# Altium footprint library TarabusLibrary.PcbLib: 591 footprints (part 8 of 37)
Each footprint in its own frame and in the unit in brackets; x right, y up, seen from the top. Pads: shape width x height; smd on the part's side, far side on the other; paste and mask are expansions set on the pad; w line width, h text height; cw(c..) or ccw(c..) is an arc to the next point about the centre after c.
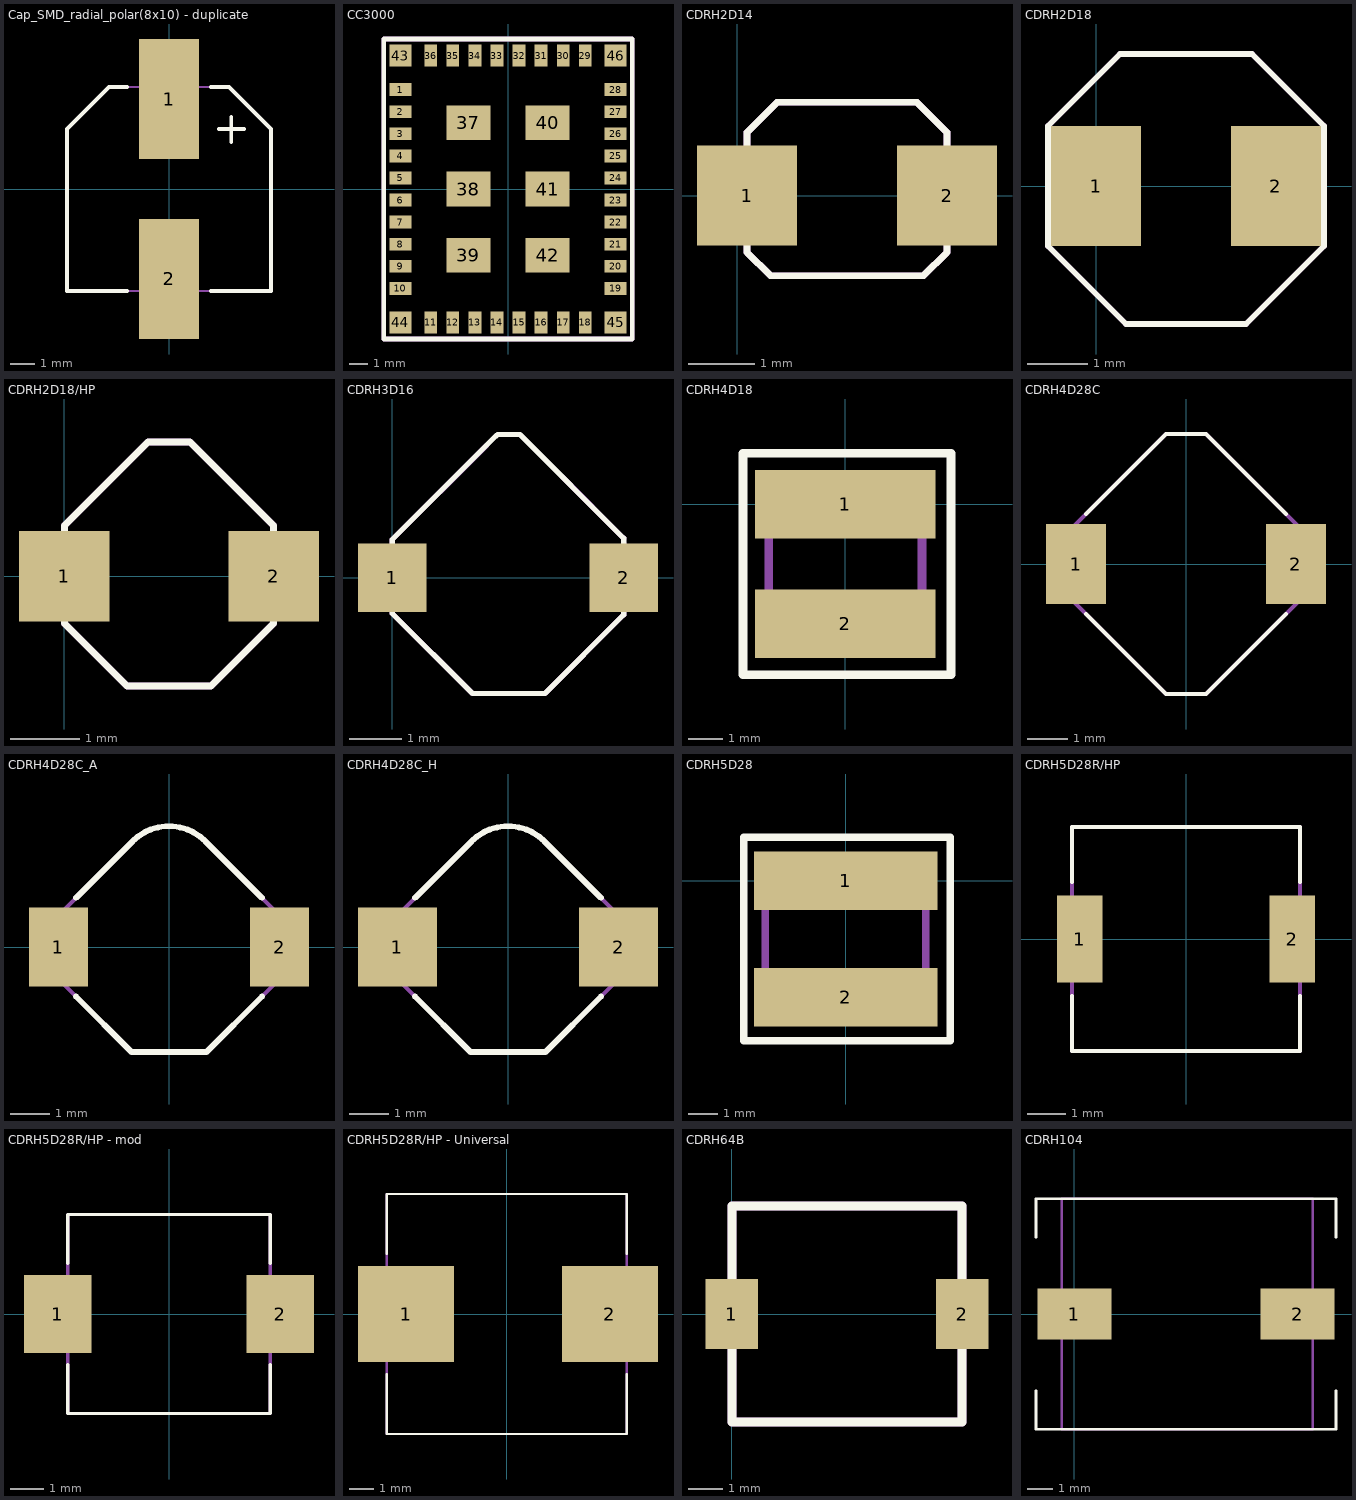
[diagram p7: the footprints below, top view; thin cyan lines are the x and y axes]

## Cap_SMD_radial_polar(8x10) - duplicate [mm] "8x10"
height 10
pads (2):
  rect 2.5x5 smd: 1(0,3.75) 2(0,-3.75)
Top Overlay:
  lines w0.15: -1.75,-4.25 -4.25,-4.25 -4.25,2.5 -2.5,4.25 -1.75,4.25 ; 1.75,-4.25 4.25,-4.25 4.25,2.5 2.5,4.25 1.75,4.25 ; 2.075,2.5 3.125,2.5 ; 2.6,1.95 2.6,3
Mechanical 7:
  lines w0.1: -4.25,-4.25 -4.25,2.5 -2.5,4.25 2.5,4.25 4.25,2.5 4.25,-4.25 -4.25,-4.25
Mechanical 10:
  text ".Designator" at -1.75,0.25 h0.8
  text ".Comment" at -1.25,-0.5 h0.6
3D body "User Library-ALU-F.STEP": height 10.2, standoff 0, extent -4.15,-4.95 4.15,4.95

## CC3000 [mm]
pads (46):
  rect 1.2x0.7 smd: 1(-5.85,5.4) 2(-5.85,4.2) 3(-5.85,3) 4(-5.85,1.8) 5(-5.85,0.6) 6(-5.85,-0.6) 7(-5.85,-1.8) 8(-5.85,-3) 9(-5.85,-4.2) 10(-5.85,-5.4) 19(5.85,-5.4) 20(5.85,-4.2) 21(5.85,-3) 22(5.85,-1.8) 23(5.85,-0.6) 24(5.85,0.6) 25(5.85,1.8) 26(5.85,3) 27(5.85,4.2) 28(5.85,5.4)
  rect 0.7x1.2 smd: 11(-4.2,-7.25) 12(-3,-7.25) 13(-1.8,-7.25) 14(-0.6,-7.25) 15(0.6,-7.25) 16(1.8,-7.25) 17(3,-7.25) 18(4.2,-7.25) 29(4.2,7.25) 30(3,7.25) 31(1.8,7.25) 32(0.6,7.25) 33(-0.6,7.25) 34(-1.8,7.25) 35(-3,7.25) 36(-4.2,7.25)
  rect 2.4x1.9 smd: 37(-2.15,3.6) 38(-2.15,0) 39(-2.15,-3.6) 40(2.15,3.6) 41(2.15,0) 42(2.15,-3.6)
  rect 1.2x1.2 smd: 43(-5.85,7.25) 44(-5.85,-7.25) 45(5.85,-7.25) 46(5.85,7.25)
Top Overlay:
  lines w0.254: -6.75,-8.15 -6.75,8.15 6.75,8.15 6.75,-8.15 -6.75,-8.15
Mechanical 7:
  lines w0.254: -6.75,-8.15 6.75,-8.15 6.75,8.15 -6.75,8.15 -6.75,-8.15
3D body: height 2, standoff 0.05, extent -6.75,-8.15 6.75,8.15

## CDRH2D14 [mm]
pads (2):
  rect 1.5x1.5 smd mask+0: 1(0.15,0) 2(3.15,0)
Top Overlay:
  lines w0.1: 0.15,-0.85 0.15,0.95 0.6,1.4 2.7,1.4 3.15,0.95 3.15,-0.85 2.8,-1.2 0.5,-1.2 0.15,-0.85
Mechanical 7:
  lines w0.1: 0.15,-0.85 0.15,0.95 0.6,1.4 2.7,1.4 3.15,0.95 3.15,-0.85 2.8,-1.2 0.5,-1.2 0.15,-0.85

## CDRH2D18 [mm]
pads (2):
  rect 1.5x2 smd mask+0: 1(0,0) 2(3,0)
Top Overlay:
  lines w0.1: -0.8,-1 -0.8,1 0.4,2.2 2.6,2.2 3.8,1 3.8,-1 2.5,-2.3 0.5,-2.3 -0.8,-1
Mechanical 7:
  lines w0.1: -0.8,-1 0.5,-2.3 2.5,-2.3 3.8,-1 3.8,1 2.6,2.2 0.4,2.2 -0.8,1 -0.8,-1
Mechanical 10:
  text ".Comment" at 1.5,-3.5 h0.6
  text ".Designator" at -3.5,3.75 h0.8
3D body "User Library-cdrh2d18.STEP": height 2, standoff 0, extent -0.676,-2.175 3.676,2.176

## CDRH2D18/HP [mm]
height 2
pads (2):
  rect 1.3x1.3 smd: 1(0,0) 2(3,0)
Top Overlay:
  lines w0.1: 0,-0.675 0.9,-1.575 2.1,-1.575 3,-0.675 3,0.65 3,0.725 1.8,1.925 1.2,1.925 0,0.725 0,-0.675
Mechanical 7:
  lines w0.1: 0,-0.675 0,0.725 1.2,1.925 1.8,1.925 3,0.725 3,0.65 3,-0.675 2.1,-1.575 0.9,-1.575 0,-0.675
3D body: height 2, standoff 0, extent 0,-1.575 3,1.925

## CDRH3D16 [mm]
pads (2):
  rect 1.3x1.3 smd: 1(0,0) 2(4.4,0)
Top Overlay:
  lines w0.1: 1.975,2.7 0,0.725 0,-0.675 1.525,-2.2 2.9,-2.2 4.4,-0.7 ; 2,2.725 2.425,2.725 4.4,0.75 4.4,-0.675
Mechanical 7:
  lines w0.1: 1.8,2.525 0,0.725 0,-0.675 1.525,-2.2 2.9,-2.2 4.4,-0.7 ; 3.225,1.925 4.4,0.75 ; 4.4,-0.675 4.4,0.65
3D body: height 2, standoff 0, extent 0,-2.225 4.4,2.725

## CDRH4D18 [mm]
pads (2):
  rect 5.3x2 smd mask+0: 1(0,0) 2(0,-3.5)
Top Overlay:
  lines w0.254: -3,-5 -3,1.5 3.1,1.5 3.1,-5 -3,-5
Mechanical 7:
  lines w0.254: -2.25,-4 2.25,-4 2.25,0.5 -2.25,0.5 -2.25,-4

## CDRH4D28C [mm]
height 3
pads (2):
  rect 1.5x2 smd mask+0: 1(-2.75,0) 2(2.75,0)
Top Overlay:
  lines w0.1: -2.5,-1.25 -0.5,-3.25 0.5,-3.25 2.5,-1.25 ; -2.5,1.25 -0.5,3.25 0.5,3.25 2.5,1.25
Mechanical 7:
  lines w0.1: -3,-0.75 -0.5,-3.25 0.5,-3.25 3,-0.75 3,-0.125 3,0.125 3,0.75 0.5,3.25 0,3.25 -0.5,3.25 -3,0.75 -3,-0.75
Mechanical 10:
  text ".Comment" at 1.5,-3.5 h0.6
  text ".Designator" at -3.5,3.75 h0.8
3D body: height 3, standoff 0, extent -3,-3.25 3,3.25

## CDRH4D28C_A [mm]
height 3
pads (2):
  rect 1.5x2 smd: 1(-2.8,0) 2(2.8,0)
Top Overlay:
  lines w0.15: -2.356,-1.25 -0.955,-2.652 0.955,-2.652 2.356,-1.25 ; -2.353,1.253 -0.919,2.687 cw(c0,1.768) 0.919,2.687 2.353,1.253
Mechanical 7:
  lines w0.1: -2.899,-0.707 -2.899,0.707 -0.919,2.687 cw(c0,1.768) 0.919,2.687 2.899,0.707 2.899,-0.707 0.955,-2.652 -0.955,-2.652 -2.899,-0.707
Mechanical 10:
  text ".Designator" at -0.985,0.265 h0.8
  text ".Comment" at -0.985,-0.425 h0.6
3D body: height 3, standoff 0, extent -2.899,-2.652 2.899,2.687
3D body: height 3, standoff 0, extent -1.29,0.47 1.3,3.065

## CDRH4D28C_H [mm]
height 3
pads (2):
  rect 2x2 smd: 1(-2.8,0) 2(2.8,0)
Top Overlay:
  lines w0.15: -2.356,-1.25 -0.955,-2.652 0.955,-2.652 2.356,-1.25 ; -2.353,1.253 -0.919,2.687 cw(c0,1.768) 0.919,2.687 2.353,1.253
Mechanical 7:
  lines w0.1: -2.899,-0.707 -0.955,-2.652 0.955,-2.652 2.899,-0.707 2.899,0.707 0.919,2.687 ccw(c0,1.768) -0.919,2.687 -2.899,0.707 -2.899,-0.707
Mechanical 10:
  text ".Comment" at -0.985,-0.425 h0.6
  text ".Designator" at -0.985,0.265 h0.8
3D body: height 3, standoff 0, extent -1.29,0.47 1.3,3.065
3D body: height 3, standoff 0, extent -2.899,-2.652 2.899,2.687

## CDRH5D28 [mm]
pads (2):
  rect 6.3x2 smd mask+0: 1(0,0) 2(0,-4)
Top Overlay:
  lines w0.254: -3.5,-5.5 3.6,-5.5 3.6,1.5 -3.5,1.5 -3.5,-5.5
Mechanical 7:
  lines w0.254: -2.75,-4.5 -2.75,0.5 2.75,0.5 2.75,-4.5 -2.75,-4.5
3D body: height 3, standoff 0, extent -3.5,-5.5 3.6,1.5

## CDRH5D28R/HP [mm]
height 2.8
pads (2):
  rect 1.2x2.3 smd mask+0: 1(-2.8,0) 2(2.8,0)
Top Overlay:
  lines w0.1: -3,-1.5 -3,-2.95 3,-2.95 3,-1.5 ; -3,1.5 -3,2.95 3,2.95 3,1.5
Mechanical 7:
  lines w0.1: -3,-2.95 3,-2.95 3,1.5 3,2.95 -3,2.95 -3,1.5 -3,-2.95
Mechanical 10:
  text ".Designator" at -3,3.25 h0.8
  text ".Comment" at -2.8,-3.5 h0.6
3D body: height 2.8, standoff 0, extent -3,-3 3,3

## CDRH5D28R/HP - mod [mm]
height 2.8
pads (2):
  rect 2x2.3 smd mask+0: 1(-3.3,0) 2(3.3,0)
Top Overlay:
  lines w0.1: -3,-1.5 -3,-2.95 3,-2.95 3,-1.5 ; -3,1.5 -3,2.95 3,2.95 3,1.5
Mechanical 7:
  lines w0.1: -3,-2.95 3,-2.95 3,1.5 3,2.95 -3,2.95 -3,1.5 -3,-2.95
Mechanical 10:
  text ".Designator" at -3,3.25 h0.8
  text ".Comment" at -2.8,-3.5 h0.6
3D body "SUMIDA-CDRH5D28R_H125.STEP": height 2.73, standoff -0.03, extent -3.035,-3 3.035,3

## CDRH5D28R/HP - Universal [mm]
height 2.8
pads (2):
  rect 4x4 smd mask+0: 1(-4.2,0) 2(4.3,0)
Top Overlay:
  lines w0.1: -5,-2.5 -5,-5 5,-5 5,-2.5 ; -5,2.5 -5,5 5,5 5,2.5
Mechanical 7:
  lines w0.1: -5,-5 -5,3.5 -5,5 5,5 5,-0.5 5,-5 -5,-5
Mechanical 10:
  text ".Comment" at -2.8,-3.5 h0.6
  text ".Designator" at -3,3.25 h0.8
3D body "SUMIDA-CDRH5D28R_H125.STEP": height 2.73, standoff -0.03, extent -3.035,-3 3.035,3

## CDRH64B [mm]
pads (2):
  rect 1.5x2 smd mask+0: 1(0,0) 2(6.6,0)
Top Overlay:
  lines w0.254: 0,-3.1 6.6,-3.1 6.6,3.1 0,3.1 0,-3.1
Mechanical 7:
  lines w0.254: 0,-3.1 6.6,-3.1 6.6,3.1 0,3.1 0,-3.1
Mechanical 10:
  text ".Comment" at 4.25,-3.5 h0.6
  text ".Designator" at -0.75,3.75 h0.8
3D body: height 5, standoff 0, extent 0,-3.1 6.6,3.1

## CDRH104 [mm]
pads (2):
  rect 2.9x2 smd mask+0: 1(0,0) 2(8.7,0)
Top Overlay:
  lines w0.1: -1.5,-3 -1.5,-4.5 10.2,-4.5 10.2,-3 ; -1.5,3 -1.5,4.5 10.2,4.5 10.2,3
Mechanical 7:
  lines w0.1: -0.5,-4.5 -0.5,4.5 9.3,4.5 9.3,0.15 9.3,-4.5 -0.5,-4.5
Mechanical 10:
  text ".Comment" at 2.95,-7 h0.6
  text ".Designator" at 4.95,7 h0.8
3D body "User Library-CDRH104.STEP": height 5, standoff 0, extent -0.55,-4.45 9.25,4.45